# Altium footprint library HoangLong_Library.PcbLib: 81 footprints (part 3 of 6)
Each footprint in its own frame and in the unit in brackets; x right, y up, seen from the top. Pads: shape width x height; smd on the part's side, far side on the other; paste and mask are expansions set on the pad; w line width, h text height; cw(c..) or ccw(c..) is an arc to the next point about the centre after c.
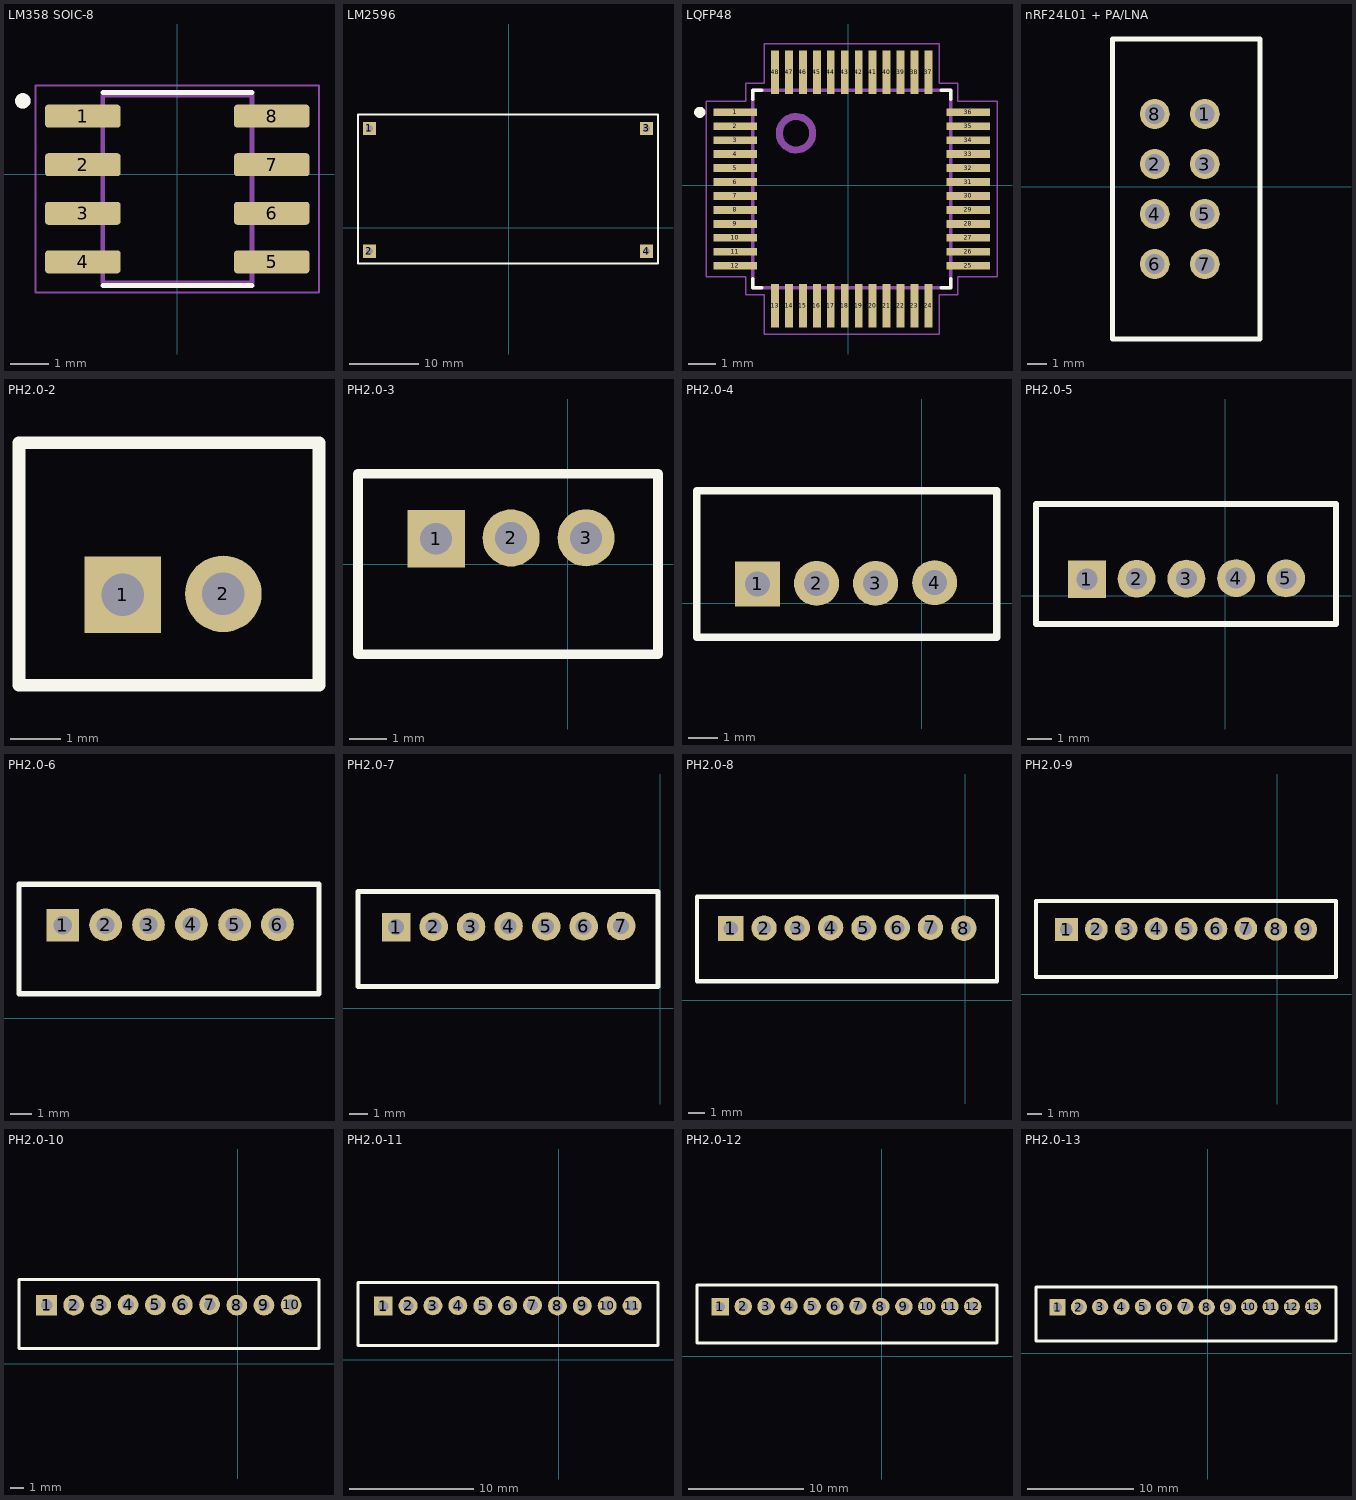
[diagram p2: the footprints below, top view; thin cyan lines are the x and y axes]

## LM358 SOIC-8 [mm]
pads (8):
  rrect25% 1.97x0.6 smd: 1(-2.47,1.524) 2(-2.47,0.254) 3(-2.47,-1.016) 4(-2.47,-2.286) 5(2.47,-2.286) 6(2.47,-1.016) 7(2.47,0.254) 8(2.47,1.524)
Top Overlay:
  circle w0.2: c-4.04,1.924 r0.1
  lines w0.127: -1.95,-2.906 1.95,-2.906 ; -1.95,2.144 1.95,2.144
Mechanical 13:
  circle w0.2: c-4.04,1.924 r0.1
  lines w0.127: -1.95,-2.833 1.95,-2.833 1.95,2.071 -1.95,2.071 -1.95,-2.833
Mechanical 15:
  lines w0.05: -3.705,-3.083 3.705,-3.083 3.705,2.321 -3.705,2.321 -3.705,-3.083
3D body "step_temp.STEP": height 1.75, standoff 0, extent -2.997,-2.832 2.997,2.07

## LM2596 [mil]
pads (4):
  rect 75x75 hole 39.37: 1(-795,565) 2(-795,-135) 3(785,565) 4(785,-135)
Top Overlay:
  lines w10: -860,-205 850,-205 850,645 -860,645 -860,-205
3D body "LM2596 DC to DC Buck Converter 3 A.STEP": height 575.59, standoff -20.87, extent -855.39,-203.31 845.39,633.31

## LQFP48 [mm]
pads (48):
  rect 1.56x0.28 smd: 1(-4.053,2.623) 2(-4.053,2.123) 3(-4.053,1.623) 4(-4.053,1.123) 5(-4.053,0.623) 6(-4.053,0.123) 7(-4.053,-0.377) 8(-4.053,-0.877) 9(-4.053,-1.377) 10(-4.053,-1.877) 11(-4.053,-2.377) 12(-4.053,-2.877) 25(4.307,-2.877) 26(4.307,-2.377) 27(4.307,-1.877) 28(4.307,-1.377) 29(4.307,-0.877) 30(4.307,-0.377) 31(4.307,0.123) 32(4.307,0.623) 33(4.307,1.123) 34(4.307,1.623) 35(4.307,2.123) 36(4.307,2.623)
  rect 0.28x1.56 smd: 13(-2.623,-4.307) 14(-2.123,-4.307) 15(-1.623,-4.307) 16(-1.123,-4.307) 17(-0.623,-4.307) 18(-0.123,-4.307) 19(0.377,-4.307) 20(0.877,-4.307) 21(1.377,-4.307) 22(1.877,-4.307) 23(2.377,-4.307) 24(2.877,-4.307) 37(2.877,4.053) 38(2.377,4.053) 39(1.877,4.053) 40(1.377,4.053) 41(0.877,4.053) 42(0.377,4.053) 43(-0.123,4.053) 44(-0.623,4.053) 45(-1.123,4.053) 46(-1.623,4.053) 47(-2.123,4.053) 48(-2.623,4.053)
Top Overlay:
  circle w0.2: c-5.323,2.623 r0.1
  lines w0.127: -3.423,-3.347 -3.423,-3.677 -3.093,-3.677 ; -3.423,3.093 -3.423,3.423 -3.093,3.423 ; 3.347,-3.677 3.677,-3.677 3.677,-3.347 ; 3.347,3.423 3.677,3.423 3.677,3.093
Mechanical 13:
  drawing of 53 lines, arcs and shapes, not listed
Mechanical 15:
  lines w0.05: -5.083,-3.267 -3.673,-3.267 -3.673,-3.927 -3.013,-3.927 -3.013,-5.337 3.267,-5.337 3.267,-3.927 3.927,-3.927 3.927,-3.267 5.337,-3.267 5.337,3.013 3.927,3.013 3.927,3.673 3.267,3.673 3.267,5.083 -3.013,5.083 -3.013,3.673 -3.673,3.673 -3.673,3.013 -5.083,3.013 -5.083,-3.267
3D body "W5500--3DModel-STEP-56544.STEP": height 1.6, standoff 0, extent -4.373,-4.627 4.627,4.373

## nRF24L01 + PA/LNA [mil]
pads (8):
  round 60 hole 39.37: 1(-1120,145) 2(-1220,45) 3(-1120,45) 4(-1220,-55) 5(-1120,-55) 6(-1220,-155) 7(-1120,-155) 8(-1220,145)
Top Overlay:
  lines w10: -1305,-305 -1305,295 -1010,295 -1010,-305 -1305,-305
3D body "NRF24l01_with_antenna.STEP": height 3757.81, standoff -127.56, extent -1306.01,-305.39 1606.01,295

## PH2.0-2 [mil]
pads (2):
  rect 60x60 hole 33.46: 1(176.34,110.81)
  round 60 hole 33.46: 2(255.07,111.63)
Top Overlay:
  lines w10: 95,40 95,230 330,230 330,225 330,45 330,40 95,40
3D body "JST - PH - Thru (V) - 2Pin - 2.00mm.stp": height 235.94, standoff -116.06, extent 99.63,43.07 330.37,227.07

## PH2.0-3 [mil]
pads (3):
  rect 60x60 hole 33.46: 1(-137.91,26.55)
  round 60 hole 33.46: 2(-59.18,27.37) 3(19.49,27.47)
Top Overlay:
  lines w10: -220,-95 95,-95 95,95 -220,95 -220,-95
3D body "JST - PH - Thru (V) - 3Pin - 2.00mm.stp": height 239.87, standoff -112.13, extent -214.74,-92.07 94.74,91.93

## PH2.0-4 [mil]
pads (4):
  rect 60x60 hole 33.46: 1(-219.33,25.84)
  round 60 hole 33.46: 2(-140.6,26.66) 3(-61.93,26.77) 4(16.8,27.59)
Top Overlay:
  lines w10: -300,-45 -300,150 100,150 100,-45 -300,-45
3D body "JST - PH - Thru (V) - 4Pin - 2.00mm.stp": height 239.87, standoff -112.13, extent -294.11,-39 94.11,145

## PH2.0-5 [mil]
pads (5):
  rect 60x60 hole 33.46: 1(-219.33,25.84)
  round 60 hole 33.46: 2(-140.6,26.66) 3(-61.93,26.77) 4(16.8,27.59) 5(95.82,27.22)
Top Overlay:
  lines w10: -300,-45 175,-45 175,145 -300,145 -300,-45
3D body "JST - PH - Thru (V) - 5Pin - 2.00mm.stp": height 239.87, standoff -112.13, extent -296.96,-42 170,142

## PH2.0-6 [mil]
pads (6):
  rect 60x60 hole 33.46: 1(-555,170)
  round 60 hole 33.46: 2(-476.27,170.82) 3(-397.6,170.93) 4(-318.87,171.75) 5(-239.84,171.37) 6(-161.18,171.48)
Top Overlay:
  lines w10: -635,45 -85,45 -85,245 -635,245 -635,45
3D body "JST - PH - Thru (V) - 6Pin - 2.00mm.stp": height 232, standoff -120, extent -632.85,52.93 -87.15,236.93

## PH2.0-7 [mil]
pads (7):
  rect 60x60 hole 33.46: 1(-555,170)
  round 60 hole 33.46: 2(-476.27,170.82) 3(-397.6,170.93) 4(-318.87,171.75) 5(-239.84,171.37) 6(-161.18,171.48) 7(-82.45,172.3)
Top Overlay:
  lines w10: -635,45 -5,45 -5,245 -635,245 -635,45
3D body "JST - PH - Thru (V) - 7Pin - 2.00mm.stp": height 239.87, standoff -112.13, extent -632.22,52.93 -7.78,236.93

## PH2.0-8 [mil]
pads (8):
  rect 60x60 hole 33.46: 1(-555,170)
  round 60 hole 33.46: 2(-476.27,170.82) 3(-397.6,170.93) 4(-318.87,171.75) 5(-239.84,171.37) 6(-161.18,171.48) 7(-82.45,172.3) 8(-3.38,170.43)
Top Overlay:
  lines w10: -635,45 75,45 75,245 -635,245 -635,45
3D body "JST - PH - Thru (V) - 8Pin - 2.00mm.stp": height 232, standoff -120, extent -631.59,52.93 71.59,236.93

## PH2.0-9 [mil]
pads (9):
  rect 60x60 hole 33.46: 1(-555,170)
  round 60 hole 33.46: 2(-476.27,170.82) 3(-397.6,170.93) 4(-318.87,171.75) 5(-239.84,171.37) 6(-161.18,171.48) 7(-82.45,172.3) 8(-3.38,170.43) 9(75.29,170.53)
Top Overlay:
  lines w10: -635,45 155,45 155,245 -635,245 -635,45
3D body "JST - PH - Thru (V) - 9Pin - 2.00mm.stp": height 239.87, standoff -112.13, extent -630.96,52.93 150.96,236.93

## PH2.0-10 [mil]
pads (10):
  rect 60x60 hole 33.46: 1(-555,170)
  round 60 hole 33.46: 2(-476.27,170.82) 3(-397.6,170.93) 4(-318.87,171.75) 5(-239.84,171.37) 6(-161.18,171.48) 7(-82.45,172.3) 8(-3.38,170.43) 9(75.29,170.53) 10(154.02,171.35)
Top Overlay:
  lines w10: -635,45 235,45 235,245 -635,245 -635,45
3D body "JST - PH - Thru (V) - 10Pin - 2.00mm.stp": height 239.87, standoff -112.13, extent -630.33,52.93 230.33,236.93

## PH2.0-11 [mil]
pads (11):
  rect 60x60 hole 33.46: 1(-555,170)
  round 60 hole 33.46: 2(-476.27,170.82) 3(-397.6,170.93) 4(-318.87,171.75) 5(-239.84,171.37) 6(-161.18,171.48) 7(-82.45,172.3) 8(-3.38,170.43) 9(75.29,170.53) 10(154.02,171.35) 11(233.05,170.98)
Top Overlay:
  lines w10: -635,45 315,45 315,245 -635,245 -635,45
3D body "JST - PH - Thru (V) - 11Pin - 2.00mm.stp": height 232, standoff -120, extent -629.7,52.93 309.7,236.93

## PH2.0-12 [mil]
pads (12):
  rect 60x60 hole 33.46: 1(-555,170)
  round 60 hole 33.46: 2(-476.27,170.82) 3(-397.6,170.93) 4(-318.87,171.75) 5(-239.84,171.37) 6(-161.18,171.48) 7(-82.45,172.3) 8(-3.38,170.43) 9(75.29,170.53) 10(154.02,171.35) 11(233.05,170.98) 12(311.71,171.09)
Top Overlay:
  lines w10: -635,45 395,45 395,245 -635,245 -635,45
3D body "JST - PH - Thru (V) - 12Pin - 2.00mm.stp": height 239.87, standoff -112.13, extent -629.07,52.93 389.07,236.93

## PH2.0-13 [mil]
pads (13):
  rect 60x60 hole 33.46: 1(-555,170)
  round 60 hole 33.46: 2(-476.27,170.82) 3(-397.6,170.93) 4(-318.87,171.75) 5(-239.84,171.37) 6(-161.18,171.48) 7(-82.45,172.3) 8(-3.38,170.43) 9(75.29,170.53) 10(154.02,171.35) 11(233.05,170.98) 12(311.71,171.09) 13(390.44,171.91)
Top Overlay:
  lines w10: -635,45 475,45 475,245 -635,245 -635,45
3D body "JST - PH - Thru (V) - 13Pin - 2.00mm.stp": height 239.87, standoff -112.13, extent -628.44,52.93 468.44,236.93